# Altium footprint library 3.01-按键按钮.PcbLib: 78 footprints (part 5 of 5)
Each footprint in its own frame and in the unit in brackets; x right, y up, seen from the top. Pads: shape width x height; smd on the part's side, far side on the other; paste and mask are expansions set on the pad; w line width, h text height; cw(c..) or ccw(c..) is an arc to the next point about the centre after c.
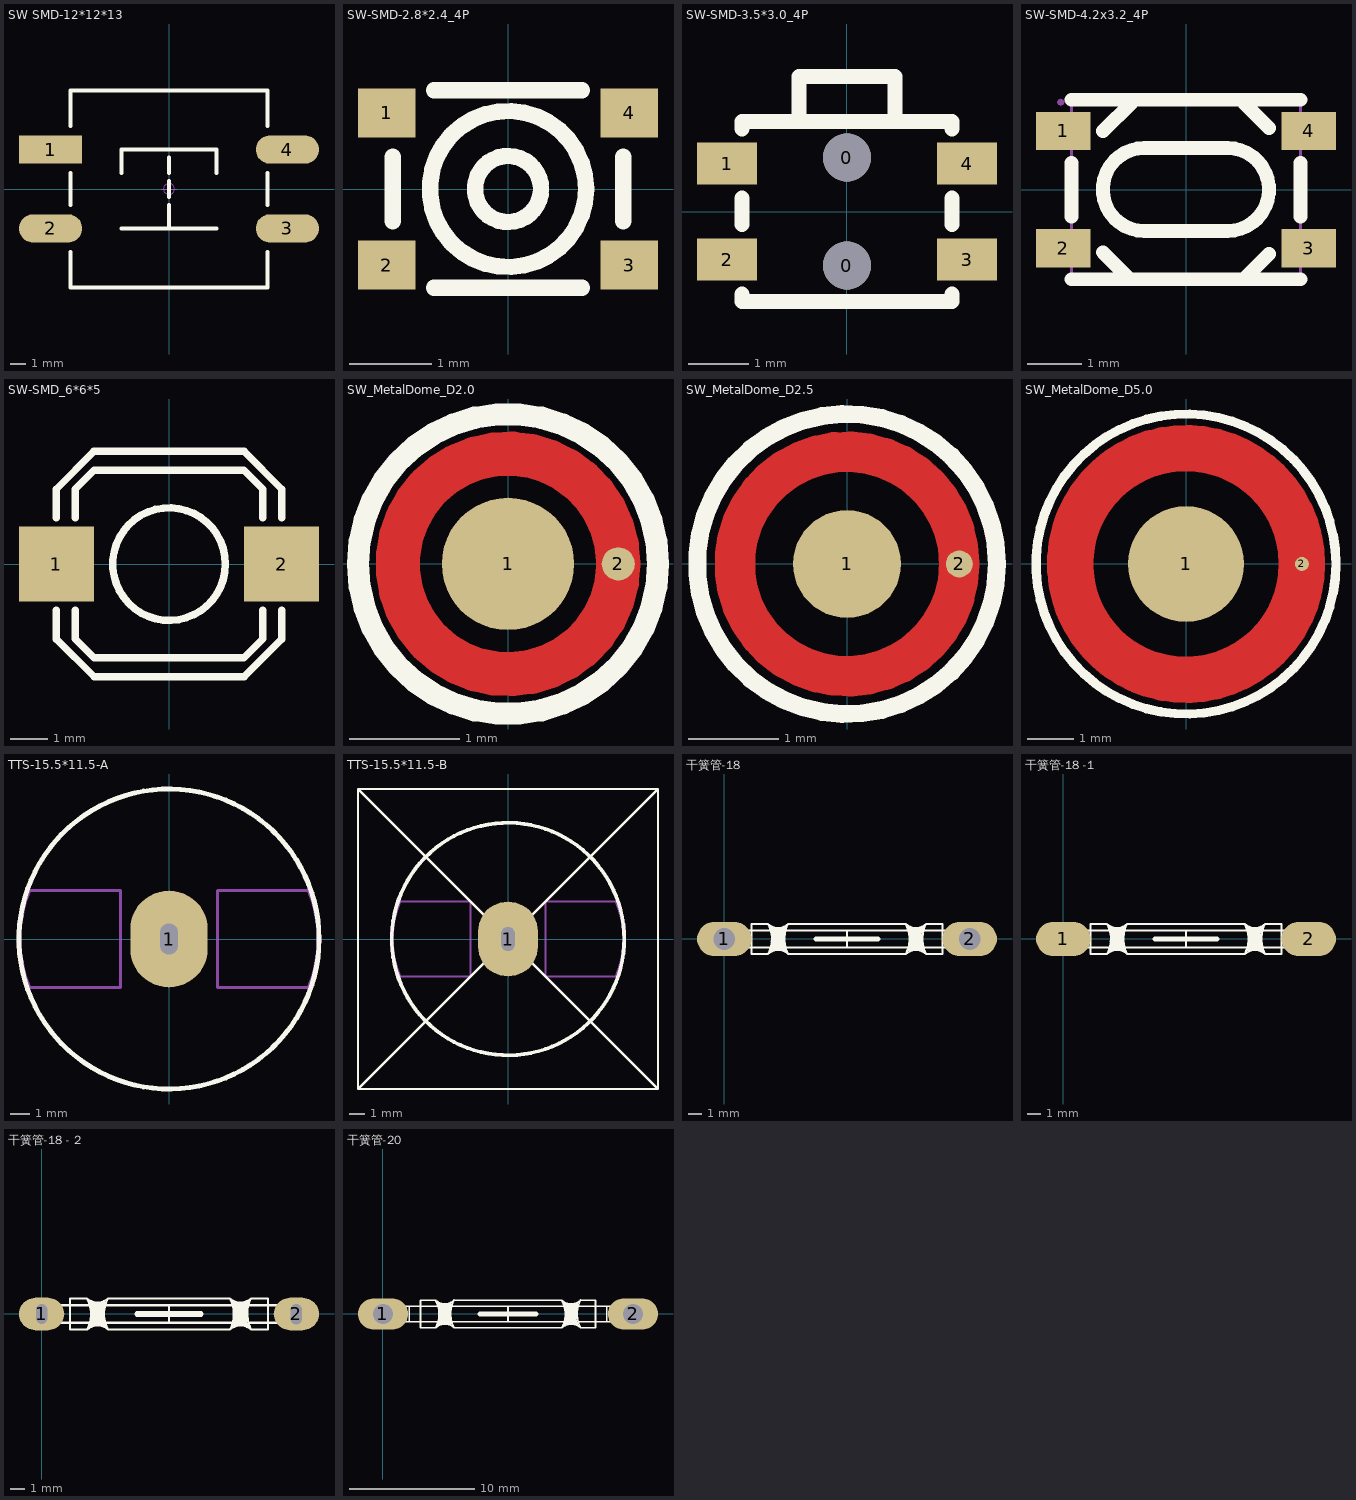
[diagram p4: the footprints below, top view; thin cyan lines are the x and y axes]

## SW SMD-12*12*13 [mm] "12*12*13mm"
pads (4):
  rect 4x1.8 smd: 1(-7.5,2.5)
  oval 4x1.8 smd: 2(-7.5,-2.5) 3(7.5,-2.5) 4(7.5,2.5)
Top Overlay:
  lines w0.254: -6.25,-4 -6.25,-6.25 6.25,-6.25 6.25,-4 ; -6.25,-1 -6.25,1 ; -6.25,4 -6.25,6.25 6.25,6.25 6.25,4 ; -3,-2.5 3,-2.5 ; -3,1 -3,2.5 3,2.5 3,1 ; 0,-2.5 0,-1 ; 0,-0.5 0,0.5 ; 0,1 0,2 ; 6.25,-1 6.25,1
Mechanical 15:
  circle w0.05: c0,0 r0.35
  lines w0.05: -0.5,0 0.5,0 ; 0,-0.5 0,0.5
3D body: height 13.15, standoff 0, extent -7.6,-6 7.6,6

## SW-SMD-2.8*2.4_4P [mm]
pads (4):
  rect 0.7x0.6 smd mask+0.05: 1(-1.475,0.925) 2(-1.475,-0.925) 3(1.475,-0.925) 4(1.475,0.925)
Top Overlay:
  circle w0.2: c0,0 r0.95
  circle w0.2: c0,0 r0.402
  lines w0.2: -1.4,-0.394 -1.4,-0.26 -1.4,0.26 -1.4,0.394 ; -0.9,-1.2 0.9,-1.2 ; -0.9,1.2 0.9,1.2 ; 1.4,-0.394 1.4,-0.26 1.4,0.26 1.4,0.394
3D body: height 0.65, standoff 0, extent -1.5,-1.195 1.5,1.205

## SW-SMD-3.5*3.0_4P [mm]
pads (6):
  round 0.8 hole 0.8 unplated mask+0: 0(0,-0.9) 0(0,0.9)
  rect 1x0.7 smd mask+0.051: 1(-2,0.8) 2(-2,-0.8) 3(2,-0.8) 4(2,0.8)
Top Overlay:
  lines w0.254: -1.75,-1.5 -1.75,-1.381 ; -1.75,-0.219 -1.75,0.219 ; -1.75,1.381 -1.75,1.5 1.75,1.5 1.75,1.381 ; -1.73,-1.5 1.75,-1.5 1.75,-1.381 ; -0.8,1.63 -0.8,2.25 0.8,2.25 0.8,1.63 ; 1.75,-0.219 1.75,0.219
3D body: height 1.33, standoff -0.47, extent -2.3,-1.507 2.3,2.243

## SW-SMD-4.2x3.2_4P [mm]
pads (4):
  rect 1.001x0.701 smd mask+0.051: 1(-2.25,1.074) 2(-2.25,-1.074) 3(2.25,-1.074) 4(2.25,1.074)
Top Overlay:
  lines w0.254: -2.101,-1.646 2.101,-1.646 ; -2.101,-0.493 -2.101,0.493 ; -2.101,1.646 2.101,1.646 ; -1.519,-1.151 -1.069,-1.6 ; -1.519,1.074 -0.993,1.6 ; -0.763,-0.761 cw(c-0.763,0.001) -0.763,0.763 ; -0.762,-0.762 0.762,-0.762 ; -0.762,0.762 0.762,0.762 cw(c0.761,0.001) 0.761,-0.761 ; 1.052,1.6 1.519,1.13 ; 1.102,-1.6 1.519,-1.181 ; 2.101,-0.493 2.101,0.493
Mechanical 15:
  region: -2.299,-0.8 -1.801,-0.8 -1.801,-1.349 -2.299,-1.349
  region: 1.801,-0.8 2.299,-0.8 2.299,-1.349 1.801,-1.349
  region: 1.801,1.349 2.299,1.349 2.299,0.8 1.801,0.8
  region: -2.299,1.349 -1.801,1.349 -1.801,0.8 -2.299,0.8
  region: -2.233,1.6 -2.252,1.647 -2.299,1.666 -2.345,1.647 -2.365,1.6 -2.345,1.554 -2.299,1.534 -2.252,1.554
  lines w0.051: -2.101,-1.6 2.101,-1.6 2.101,1.6 -2.101,1.6 -2.101,-1.6
3D body: height 2.52, standoff 0.01, extent -2.325,-1.65 2.325,1.65

## SW-SMD_6*6*5 [mm]
pads (2):
  rect 1.999x1.999 smd mask+0.051: 1(-3,0) 2(3,0)
Top Overlay:
  circle w0.2: c0.003,-0.003 r1.501
  lines w0.2: -3,-1.232 -3,-2.002 -1.999,-3 2.002,-3 3,-2.002 3,-1.232 ; -3,1.232 -3,1.999 -2.002,3 2.002,3 3,1.999 3,1.232 ; -2.499,-1.232 -2.499,-1.999 -1.999,-2.499 1.999,-2.499 2.499,-1.999 2.499,-1.232 ; -2.499,1.232 -2.499,1.999 -1.999,2.499 1.999,2.499 2.499,1.999 2.499,1.232
3D body: height 5.02, standoff 0.02, extent -3.299,-3 3.299,3

## SW_MetalDome_D2.0 [mm] "Metal Dome_D5.0mm"
pads (2):
  round 1.2 smd mask+0.05: 1(0,0)
  round 0.3 smd mask+0.05: 2(1,0)
Top Layer:
  circle w0.4: c0,0 r1
Top Overlay:
  circle w0.2: c0,-0.001 r1.36
3D body: height 0.15, standoff 0, extent -1,-1 0.999,1

## SW_MetalDome_D2.5 [mm] "Metal Dome_D5.0mm"
pads (2):
  round 1.2 smd mask+0.05: 1(0,0)
  round 0.3 smd mask+0.05: 2(1.25,0)
Top Layer:
  circle w0.45: c0,0 r1.25
Top Overlay:
  circle w0.2: c0,0 r1.67
3D body: height 0.15, standoff 0, extent -1.251,-1.249 1.249,1.248

## SW_MetalDome_D5.0 [mm] "Metal Dome_D5.0mm"
pads (2):
  round 2.5 smd mask+0.05: 1(0,0)
  round 0.3 smd mask+0.05: 2(2.5,0)
Top Layer:
  circle w1: c0,0 r2.5
Top Overlay:
  circle w0.2: c0,-0.001 r3.237
3D body: height 0.27, standoff 0.03, extent -2.5,-2.497 2.5,2.497

## TTS-15.5*11.5-A [mm] "弹簧按键15.5mm*11.5mm(直径*高度）"
pads (1):
  oval 4x5 hole 0.9 slot 1.6 at 90 deg: 1(0,0)
Top Overlay:
  circle w0.254: c0,0 r7.75
Mechanical 15:
  lines w0.152: -7.25,-2.5 -2.5,-2.5 -2.5,2.5 -3,2.5 -7.25,2.5 ; 7.25,-2.5 2.5,-2.5 2.5,2.5 3,2.5 7.25,2.5
  lines w0.254: -7.25,-2.5 cw(c-1.25,0) -7.25,2.5 ; 7.25,-2.5 ccw(c1.25,0) 7.25,2.5
3D body: height 12.9, standoff -2.5, extent -7.75,-7.75 7.75,7.75

## TTS-15.5*11.5-B [mm] "弹簧按键15.5mm*11.5mm(直径*高度）          淘宝ID:黄晶宝石"
pads (1):
  oval 4x5 hole 0.9 slot 1.6 at 90 deg: 1(0,0)
Top Overlay:
  circle w0.254: c0,0 r7.75
  lines w0.152: -10,-10 10,10 ; -10,-10 -10,0 -10,10 ; -10,-10 10,-10 ; -10,10 10,-10 ; -10,10 10,10 ; 10,-10 10,10
Mechanical 15:
  lines w0.152: -7.25,-2.5 -2.5,-2.5 -2.5,2.5 -3,2.5 -7.25,2.5 ; 7.25,-2.5 2.5,-2.5 2.5,2.5 3,2.5 7.25,2.5
  lines w0.254: -7.25,-2.5 cw(c-1.25,0) -7.25,2.5 ; 7.25,-2.5 ccw(c1.25,0) 7.25,2.5
3D body: height 12.9, standoff -2.5, extent -7.75,-7.75 7.75,7.75

## 干簧管-18 [mm]
pads (2):
  oval 4x2.5 hole 1.6: 1(0,0) 2(18,0)
Top Overlay:
  lines w0.15: 0.8,-0.62 0.8,0.61 ; 1.1,-0.62 1.1,0.62 ; 1.99,0.62 3.4,0.62 ; 3.2,-1.1 2,-1.1 2,-0.62 ; 3.208,-1.102 cw(c3.96,-1.93) 4.71,-1.1 13.3,-1.1 ; 3.208,1.098 cw(c1.19,-0.01) 3.215,-1.105 ; 3.41,-0.62 2,-0.62 ; 4.49,-0.62 13.5,-0.62 ; 4.49,0.62 13.49,0.62 ; 4.685,1.105 ccw(c6.71,0.01) 4.692,-1.098 ; 4.702,1.102 cw(c3.95,1.93) 3.2,1.1 2,1.1 2,0.62 ; 4.707,1.098 13.298,1.098 ccw(c14.048,1.928) 14.8,1.1 16,1.1 ; 9,-0.62 9,0.62 ; 13.298,1.098 cw(c11.28,-0.01) 13.305,-1.105 cw(c14.058,-1.932) 14.808,-1.102 15.998,-1.102 15.998,1.098 ; 14.61,0.62 16,0.62 ; 14.62,-0.62 16.01,-0.62 ; 14.805,1.105 ccw(c16.83,0.01) 14.812,-1.098 ; 16.9,-0.62 16.9,0.61 ; 17.2,-0.62 17.2,0.61 ; 2,-0.62 0,-0.62 -0.5,-0.62 -0.5,0.62 0,0.62 2,0.62 ; 2,-0.62 2,0 2,0.62 ; 16,0.62 18,0.62 18.5,0.62 18.5,-0.62 18,-0.62 16,-0.62 16,0 16,0.62
  lines w0.254: 3.42,-0.74 4.44,-0.74 ; 3.42,0.74 4.43,0.74 ; 3.48,0.53 4.37,0.53 ; 3.49,-0.56 4.37,-0.56 ; 3.51,0.31 4.37,0.31 ; 3.52,-0.36 4.32,-0.36 ; 3.53,-0.15 4.28,-0.15 ; 3.54,0.09 4.3,0.09 ; 13.5,0.75 14.57,0.75 ; 13.52,-0.76 14.56,-0.76 ; 13.53,-0.72 14.46,-0.72 ; 13.57,0.52 14.49,0.52 ; 13.58,-0.55 14.43,-0.55 ; 13.62,-0.38 14.4,-0.38 ; 13.63,0.29 14.42,0.29 ; 13.64,-0.17 14.44,-0.17 ; 13.65,0.05 14.42,0.05
  lines w0.4: 6.75,0 11.25,0

## 干簧管-18 -1 [mm]
pads (2):
  oval 4x2.5 smd: 1(0,0) 2(18,0)
Top Overlay:
  lines w0.15: 0.8,-0.62 0.8,0.61 ; 1.1,-0.62 1.1,0.62 ; 1.99,0.62 3.4,0.62 ; 3.2,-1.1 2,-1.1 2,-0.62 ; 3.208,-1.102 cw(c3.96,-1.93) 4.71,-1.1 13.3,-1.1 ; 3.208,1.098 cw(c1.19,-0.01) 3.215,-1.105 ; 3.41,-0.62 2,-0.62 ; 4.49,-0.62 13.5,-0.62 ; 4.49,0.62 13.49,0.62 ; 4.685,1.105 ccw(c6.71,0.01) 4.692,-1.098 ; 4.702,1.102 cw(c3.95,1.93) 3.2,1.1 2,1.1 2,0.62 ; 4.707,1.098 13.298,1.098 ccw(c14.048,1.928) 14.8,1.1 16,1.1 ; 9,-0.62 9,0.62 ; 13.298,1.098 cw(c11.28,-0.01) 13.305,-1.105 cw(c14.058,-1.932) 14.808,-1.102 15.998,-1.102 15.998,1.098 ; 14.61,0.62 16,0.62 ; 14.62,-0.62 16.01,-0.62 ; 14.805,1.105 ccw(c16.83,0.01) 14.812,-1.098 ; 16.9,-0.62 16.9,0.61 ; 17.2,-0.62 17.2,0.61 ; 2,-0.62 2,0 2,0.62 ; 2,-0.62 0,-0.62 -0.5,-0.62 -0.5,0.62 0,0.62 2,0.62 ; 16,0.62 16,0 16,-0.62 18,-0.62 18.5,-0.62 18.5,0.62 18,0.62 16,0.62
  lines w0.254: 3.42,-0.74 4.44,-0.74 ; 3.42,0.74 4.43,0.74 ; 3.48,0.53 4.37,0.53 ; 3.49,-0.56 4.37,-0.56 ; 3.51,0.31 4.37,0.31 ; 3.52,-0.36 4.32,-0.36 ; 3.53,-0.15 4.28,-0.15 ; 3.54,0.09 4.3,0.09 ; 13.5,0.75 14.57,0.75 ; 13.52,-0.76 14.56,-0.76 ; 13.53,-0.72 14.46,-0.72 ; 13.57,0.52 14.49,0.52 ; 13.58,-0.55 14.43,-0.55 ; 13.62,-0.38 14.4,-0.38 ; 13.63,0.29 14.42,0.29 ; 13.64,-0.17 14.44,-0.17 ; 13.65,0.05 14.42,0.05
  lines w0.4: 6.75,0 11.25,0

## 干簧管-18 - 2 [mm]
pads (14):
  oval 3.2x2.3 hole 0.8: 1(0,0) 2(18,0)
  round 0.8 hole 0.8: ""(0,-0.3) ""(0,-0.3) ""(0,-0.2) ""(0,0.05) ""(0,0.25) ""(0,0.3) ""(18,-0.35) ""(18,-0.3) ""(18,-0.2) ""(18,0.05) ""(18,0.25) ""(18,0.3)
Top Overlay:
  lines w0.15: 0.8,-0.62 0.8,0.61 ; 1.1,-0.62 1.1,0.62 ; 1.99,0.62 3.4,0.62 ; 3.2,-1.1 2,-1.1 2,-0.62 ; 3.208,-1.102 cw(c3.96,-1.93) 4.71,-1.1 13.3,-1.1 ; 3.208,1.098 cw(c1.19,-0.01) 3.215,-1.105 ; 3.41,-0.62 2,-0.62 ; 4.49,-0.62 13.5,-0.62 ; 4.49,0.62 13.49,0.62 ; 4.685,1.105 ccw(c6.71,0.01) 4.692,-1.098 ; 4.702,1.102 cw(c3.95,1.93) 3.2,1.1 2,1.1 2,0.62 ; 4.707,1.098 13.298,1.098 ccw(c14.048,1.928) 14.8,1.1 16,1.1 ; 9,-0.62 9,0.62 ; 13.298,1.098 cw(c11.28,-0.01) 13.305,-1.105 cw(c14.058,-1.932) 14.808,-1.102 15.998,-1.102 15.998,1.098 ; 14.61,0.62 16,0.62 ; 14.62,-0.62 16.01,-0.62 ; 14.805,1.105 ccw(c16.83,0.01) 14.812,-1.098 ; 16.9,-0.62 16.9,0.61 ; 17.2,-0.62 17.2,0.61 ; 2,-0.62 0,-0.62 -0.5,-0.62 -0.5,0.62 0,0.62 2,0.62 ; 2,-0.62 2,0 2,0.62 ; 16,0.62 18,0.62 18.5,0.62 18.5,-0.62 18,-0.62 16,-0.62 16,0 16,0.62
  lines w0.254: 3.42,-0.74 4.44,-0.74 ; 3.42,0.74 4.43,0.74 ; 3.48,0.53 4.37,0.53 ; 3.49,-0.56 4.37,-0.56 ; 3.51,0.31 4.37,0.31 ; 3.52,-0.36 4.32,-0.36 ; 3.53,-0.15 4.28,-0.15 ; 3.54,0.09 4.3,0.09 ; 13.5,0.75 14.57,0.75 ; 13.52,-0.76 14.56,-0.76 ; 13.53,-0.72 14.46,-0.72 ; 13.57,0.52 14.49,0.52 ; 13.58,-0.55 14.43,-0.55 ; 13.62,-0.38 14.4,-0.38 ; 13.63,0.29 14.42,0.29 ; 13.64,-0.17 14.44,-0.17 ; 13.65,0.05 14.42,0.05
  lines w0.4: 6.75,0 11.25,0

## 干簧管-20 [mm]
pads (2):
  oval 4x2.5 hole 1.6: 1(0,0) 2(20,0)
Top Overlay:
  lines w0.15: 1.8,-0.62 1.8,0.61 ; 2.1,-0.62 2.1,0.62 ; 2.99,0.62 4.4,0.62 ; 4.2,-1.1 3,-1.1 3,-0.62 ; 4.208,-1.102 cw(c4.96,-1.93) 5.71,-1.1 14.3,-1.1 ; 4.208,1.098 cw(c2.19,-0.01) 4.215,-1.105 ; 4.41,-0.62 3,-0.62 ; 5.49,-0.62 14.5,-0.62 ; 5.49,0.62 14.49,0.62 ; 5.685,1.105 ccw(c7.71,0.01) 5.692,-1.098 ; 5.702,1.102 cw(c4.95,1.93) 4.2,1.1 3,1.1 3,0.62 ; 5.707,1.098 14.298,1.098 ; 10,-0.62 10,0.62 ; 15.61,0.62 17,0.62 ; 15.62,-0.62 17.01,-0.62 ; 15.805,1.105 ccw(c17.83,0.01) 15.812,-1.098 ; 16.998,1.098 16.998,-1.102 15.808,-1.102 ccw(c15.058,-1.932) 14.305,-1.105 ccw(c12.28,-0.01) 14.298,1.098 ; 17,1.1 15.8,1.1 cw(c15.048,1.928) 14.298,1.098 ; 17.9,-0.62 17.9,0.61 ; 18.2,-0.62 18.2,0.61 ; 3,-0.62 1,-0.62 0.5,-0.62 0.5,0.62 1,0.62 3,0.62 ; 3,-0.62 3,0 3,0.62 ; 17,0.62 19,0.62 19.5,0.62 19.5,-0.62 19,-0.62 17,-0.62 17,0 17,0.62
  lines w0.254: 4.42,-0.74 5.44,-0.74 ; 4.42,0.74 5.43,0.74 ; 4.48,0.53 5.37,0.53 ; 4.49,-0.56 5.37,-0.56 ; 4.51,0.31 5.37,0.31 ; 4.52,-0.36 5.32,-0.36 ; 4.53,-0.15 5.28,-0.15 ; 4.54,0.09 5.3,0.09 ; 14.5,0.75 15.57,0.75 ; 14.52,-0.76 15.56,-0.76 ; 14.53,-0.72 15.46,-0.72 ; 14.57,0.52 15.49,0.52 ; 14.58,-0.55 15.43,-0.55 ; 14.62,-0.38 15.4,-0.38 ; 14.63,0.29 15.42,0.29 ; 14.64,-0.17 15.44,-0.17 ; 14.65,0.05 15.42,0.05
  lines w0.4: 7.75,0 12.25,0